# Altium footprint library boxer_pas.PcbLib: 67 footprints (part 4 of 5)
Each footprint in its own frame and in the unit in brackets; x right, y up, seen from the top. Pads: shape width x height; smd on the part's side, far side on the other; paste and mask are expansions set on the pad; w line width, h text height; cw(c..) or ccw(c..) is an arc to the next point about the centre after c.
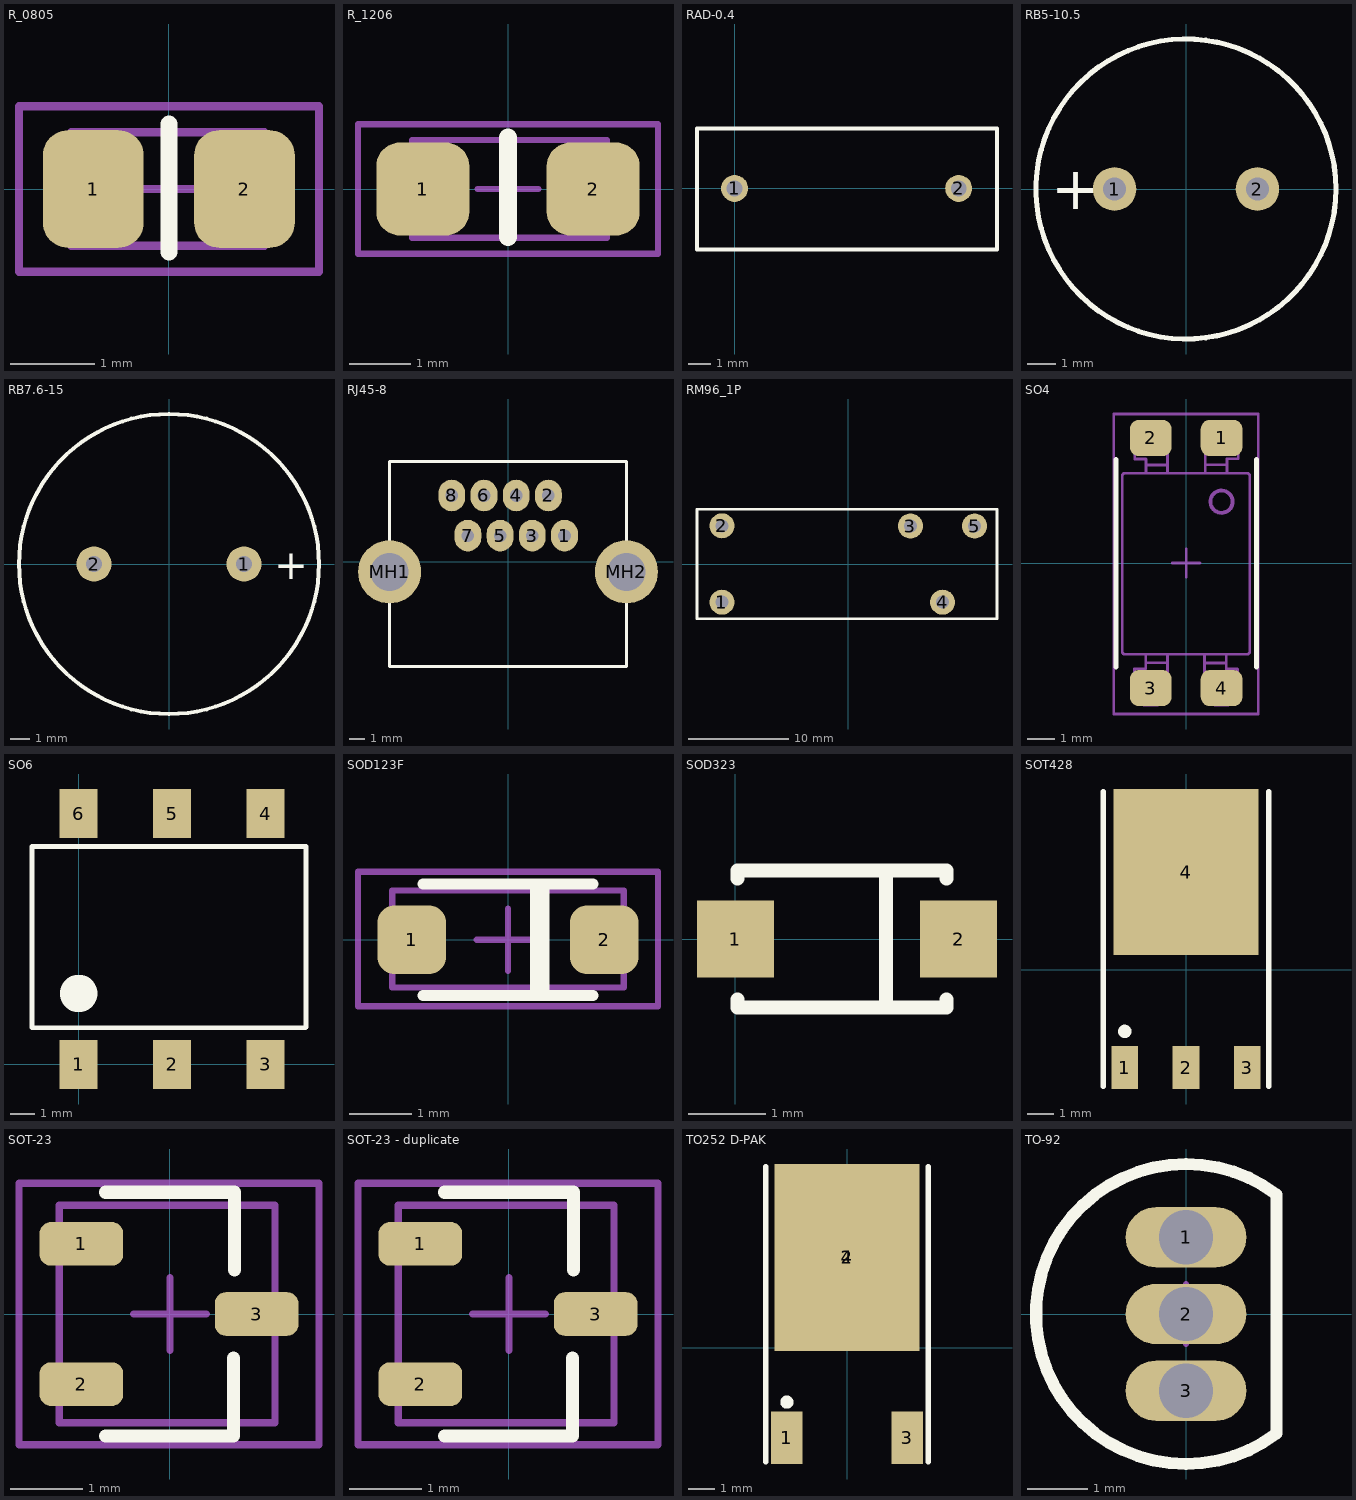
[diagram p3: the footprints below, top view; thin cyan lines are the x and y axes]

## R_0805 [mm] "Chip Resistor, Body 2.0x1.2mm, IPC Medium Density"
height 0.7
pads (2):
  rrect50% 1.2x1.4 smd: 1(-0.9,0) 2(0.9,0)
Top Overlay:
  lines w0.2: 0,-0.75 0,0.774
Mechanical 13:
  lines w0.1: -1.161,-0.675 -1.161,0.675 1.139,0.675 1.139,-0.675 -1.161,-0.675
  text ".Value" at -0.94,-0.229 h0.5
  text ".Designator" at -1.63,0.969 h0.5
Mechanical 15:
  lines w0.1: -0.5,0 0.5,0 ; 0,-0.5 0,0.5 ; -1.784,-0.986 1.788,-0.986 1.788,0.986 -1.784,0.986 -1.784,-0.986
3D body "User Library-RES_2013-0805.STEP": height 0.76, standoff 0, extent -1.161,-0.675 1.139,0.675

## R_1206 [mil]
pads (2):
  rrect50% 60x60 smd: 1(-55,0) 2(55,0)
Top Overlay:
  lines w11.81: 0,-31 0,33
Mechanical 13:
  lines w3.94: -61.99,-31.49 -61.99,31.5 -61,31.5 64,31.5 64,-31.49 -61.99,-31.49
  text ".Value" at -38,-7 h19.68
  text ".Designator" at -65.17,44.14 h19.68
Mechanical 15:
  lines w3.94: -19.68,0 19.69,0 ; 0,-19.68 0,19.69 ; -96.81,-41.81 96.81,-41.81 96.81,41.81 -96.81,41.81 -96.81,-41.81
3D body "User Library-RESC3216X06N.step": height 21.69, standoff 0, extent -61.99,-31.49 64,31.5

## RAD-0.4 [mm] "Radial Cap, Thru-Hole; 2 Leads; 0.4 in Pin Spacing"
pads (2):
  round 1.2 hole 0.7: 1(0,0) 2(10,0)
Top Overlay:
  lines w0.18: -1.676,-2.718 11.709,-2.718 11.709,2.667 -1.676,2.667 -1.676,-2.718
3D body "75186.stp": height 12.25, standoff -4.75, extent -1.592,-2.601 11.608,2.601

## RB5-10.5 [mm] "Capacitor (Radial); 2 Leads"
pads (2):
  round 1.524 hole 0.8: 1(-2.5,0) 2(2.5,0)
Top Overlay:
  circle w0.18: c0,0 r5.25
  text "+" at -4.724,-0.711 h1.5
Mechanical 1:
  circle w0.02: c0,0 r5.25
3D body "User Library-CE_R200_D400_H800.step": height 20.32, standoff -2.9, extent -5.08,-5.079 5.08,5.08

## RB7.6-15 [mil] "Polarized Capacitor (Radial); 2 Leads"
pads (2):
  round 70 hole 31.5: 1(150,0) 2(-150,0)
Top Overlay:
  circle w7.87: c0,0 r300
  text "+" at 210,-30 h59.06

## RJ45-8 [mm]
pads (10):
  oval 1.7x2 hole 0.8: 1(3.555,1.671) 2(2.535,4.211) 3(1.515,1.671) 4(0.495,4.211) 5(-0.525,1.671) 6(-1.545,4.211) 7(-2.565,1.671) 8(-3.585,4.211)
  round 4 hole 2.4 unplated: MH1(-7.525,-0.629) MH2(7.475,-0.629)
Top Overlay:
  lines w0.2: -7.525,-2.229 -7.525,-6.629 7.475,-6.629 7.475,-2.229 ; -7.525,0.971 -7.525,6.371 7.475,6.371 7.475,0.971
Mechanical 13:
  lines w0.1: -7.525,-6.629 -7.525,6.371 7.475,6.371 7.475,-6.629 -7.525,-6.629
3D body: height 14.5, standoff 0, extent -7.525,-6.629 7.475,6.371

## RM96_1P [mm] "RM96 miniature relay"
height 16.2
pads (5):
  round 2.5 hole 1.3: 1(-12.6,-3.81) 2(-12.6,3.81) 3(6.2,3.79) 4(9.4,-3.81) 5(12.6,3.79)
Top Overlay:
  lines w0.254: -15.092,-5.461 -15.092,5.461 14.832,5.461 14.832,-5.461 -15.092,-5.461
3D body "User Library-RM96-1011-35-1012.step": height 16.2, standoff -3.5, extent -14.686,-5 13.314,5

## SO4 [mm]
pads (4):
  rrect50% 1.5x1.3 smd: 1(1.27,4.485) 2(-1.27,4.485) 3(-1.27,-4.485) 4(1.27,-4.485)
Top Overlay:
  lines w0.18: -2.515,-3.723 -2.515,3.719 ; 2.515,-3.723 2.515,3.719
Mechanical 13:
  circle w0.1: c1.267,2.201 r0.4
  circle w0.1: c1.267,2.201 r0.42
  circle w0.1: c1.267,2.201 r0.38
  lines w0.1: -2.197,3.223 ccw(c-2.195,3.122) -2.296,3.124 -2.296,-3.174 ccw(c-2.195,-3.173) -2.197,-3.274 2.183,-3.274 ccw(c2.181,-3.173) 2.282,-3.174 2.282,3.124 ccw(c2.181,3.122) 2.183,3.223 -2.192,3.223 ; -1.453,-3.284 -1.453,-3.794 -1.853,-3.794 -1.853,-4.005 -1.523,-4.335 -1.523,-5.089 -1.023,-5.089 -1.023,-4.339 -0.673,-3.989 -0.673,-3.291 ; -1.449,-3.579 -0.673,-3.579 ; -1.446,3.225 -1.446,3.736 -1.846,3.736 -1.846,3.946 -1.516,4.276 -1.516,5.031 -1.016,5.031 -1.016,4.28 -0.666,3.93 -0.666,3.229 ; -1.442,3.52 -0.666,3.52 ; 0.661,-3.581 1.437,-3.581 ; 0.661,-3.28 0.661,-3.991 1.011,-4.341 1.011,-5.091 1.511,-5.091 1.511,-4.337 1.841,-4.007 1.841,-3.796 1.441,-3.796 1.441,-3.286 ; 0.687,3.225 0.687,3.932 1.038,4.282 1.038,5.033 1.538,5.033 1.538,4.278 1.867,3.948 1.867,3.738 1.468,3.738 1.468,3.229 ; 0.687,3.522 1.464,3.522
  text ".Designator" at -1.808,5.475 h0.5
  text ".Comment" at -1.676,-0.152 h0.5
Mechanical 15:
  lines w0.1: -0.5,0 0.5,0 ; 0,-0.5 0,0.5 ; -2.596,-5.415 -2.596,5.346 2.583,5.346 2.583,-5.415 -2.596,-5.415
3D body "User Library-EL817.step": height 4.67, standoff -0.01, extent -2.296,-5.115 2.283,5.046

## SO6 [mm]
pads (6):
  rect 1.55x2 smd: 1(0,0) 2(3.81,0) 3(7.62,0) 4(7.62,10.236) 5(3.81,10.236) 6(0,10.236)
Top Overlay:
  circle w1.27: c0,2.897 r0.127
  lines w0.2: 9.245,8.89 -1.905,8.89 -1.905,1.5 9.245,1.5 9.271,1.526 9.271,8.89

## SOD123F [mm]
pads (2):
  rrect50% 1.1x1.1 smd: 1(-1.537,0) 2(1.537,0)
Top Overlay:
  lines w0.18: -1.359,-0.889 1.359,-0.889 ; -1.359,0.889 1.359,0.889 ; 0.445,-0.889 0.445,0.864 ; 0.572,-0.864 0.572,0.889
Mechanical 13:
  lines w0.1: -1.85,-0.762 1.85,-0.762 1.85,0.787 -1.85,0.787 -1.85,-0.762
  text ".Comment" at -1.702,-0.178 h0.5
  text ".Designator" at -1.778,1.087 h0.5
Mechanical 15:
  lines w0.1: -0.5,0 0.5,0 ; 0,-0.5 0,0.5 ; -2.395,-1.062 2.395,-1.062 2.395,1.087 -2.395,1.087 -2.395,-1.062
3D body "User Library-SOD3716X14.step": height 1.35, standoff 0, extent -1.85,-0.762 1.85,0.787

## SOD323 [mm]
height 1.1
pads (2):
  rect 1x1 smd: 1(0,0) 2(2.9,0)
Top Overlay:
  lines w0.18: 0.025,-0.787 0.025,-0.889 2.743,-0.889 2.743,-0.787 ; 0.025,0.787 0.025,0.889 2.743,0.889 2.743,0.787 ; 1.956,-0.864 1.956,0.889
3D body "User Library-SOD323-1.step": height 1.1, standoff 0, extent 0.148,-0.675 2.748,0.675

## SOT428 [mm] "D-PAK/TO-252-AA; 3 Leads (1 Cropped); Body 10.4 (inc. leads) x 6.7 mm (LxW max)"
height 2.38
pads (4):
  rect 1x1.6 smd: 1(-2.285,-3.65) 2(0,-3.65) 3(2.285,-3.65)
  rect 5.4x6.2 smd: 4(0,3.65)
Top Overlay:
  circle w0.25: c-2.285,-2.3 r0.125
  lines w0.2: -3.085,-4.35 -3.085,6.65 ; 3.085,-4.35 3.085,6.65

## SOT-23 [mm] "SOT23, 3-Leads, Body 2.9x1.3mm, Pitch 0.95mm, Lead Span 2.5mm, IPC Medium Density"
height 1.1
pads (3):
  rrect50% 1.15x0.6 smd: 1(-1.219,0.965) 2(-1.219,-0.965) 3(1.194,0)
Top Overlay:
  lines w0.18: -0.889,-1.678 0.878,-1.678 0.878,-0.61 ; -0.889,1.676 0.889,1.676 0.889,0.61
Mechanical 13:
  lines w0.1: -1.524,-1.499 -1.524,1.499 1.448,1.499 1.448,-1.499 -1.524,-1.499
  text ".Value" at -1.016,-0.152 h0.5
  text ".Designator" at -1.681,1.782 h0.5
Mechanical 15:
  lines w0.1: -0.5,0 0.5,0 ; 0,-0.5 0,0.5 ; -2.078,-1.799 -2.078,1.799 2.053,1.799 2.053,-1.799 -2.078,-1.799
3D body "User Library-SOT95P280X135-3M[SOT23_TO-236AA].step": height 1.3, standoff 0, extent -1.525,-1.5 1.475,1.5

## SOT-23 - duplicate [mm] "SOT23, 3-Leads, Body 2.9x1.3mm, Pitch 0.95mm, Lead Span 2.5mm, IPC Medium Density"
height 1.1
pads (3):
  rrect50% 1.15x0.6 smd: 1(-1.219,0.965) 2(-1.219,-0.965) 3(1.194,0)
Top Overlay:
  lines w0.18: -0.889,-1.678 0.878,-1.678 0.878,-0.61 ; -0.889,1.676 0.889,1.676 0.889,0.61
Mechanical 13:
  lines w0.1: -1.524,-1.499 1.448,-1.499 1.448,1.499 -1.524,1.499 -1.524,-1.499
  text ".Designator" at -1.681,1.782 h0.5
  text ".Value" at -1.016,-0.152 h0.5
Mechanical 15:
  lines w0.1: -0.5,0 0.5,0 ; 0,-0.5 0,0.5 ; -2.078,-1.799 2.053,-1.799 2.053,1.799 -2.078,1.799 -2.078,-1.799
3D body "User Library-SOT95P280X135-3M[SOT23_TO-236AA].step": height 1.3, standoff 0, extent -1.525,-1.5 1.475,1.5

## TO252 D-PAK [mm] "D-PAK/TO-252-AA; 3 Leads (1 Cropped); Body 10.4 (inc. leads) x 6.7 mm (LxW max)"
height 2.38
pads (4):
  rect 1.2x2 smd: 1(-2.285,-3.425) 3(2.285,-3.425)
  rect 5.5x7.1 smd: 2(0,3.425) 4(0,3.425)
Top Overlay:
  circle w0.25: c-2.285,-2.075 r0.125
  lines w0.2: -3.085,-4.35 -3.085,6.875 ; 3.085,-4.35 3.085,6.875

## TO-92 [mm] "TO, Flat Index; 3 In-Line, Axial Leads; Body Dia. 4.5mm; Leads 0.51 x 0.48 mm (max)"
height 6.86
pads (3):
  oval 2x1 hole 0.9: 1(0,1.27) 2(0,0) 3(0,-1.27)
Top Overlay:
  lines w0.2: 1.5,-1.98 cw(c0,0) 1.5,1.98 1.5,-1.98
Mechanical 13:
  lines w0.1: 1.5,-1.98 cw(c0,0) 1.5,1.98 1.5,-1.98
Mechanical 15:
  lines w0.1: -0.5,0 0.5,0 ; 0,-0.5 0,0.5
3D body "User Library-MPSA92 Transistors PNP TO-92 3L (2,54mm).step": height 4.82, standoff -14.7, extent -2.38,-2.38 1.25,2.38